# Altium footprint library PcbLib1.PcbLib: 34 footprints (part 3 of 3)
Each footprint in its own frame and in the unit in brackets; x right, y up, seen from the top. Pads: shape width x height; smd on the part's side, far side on the other; paste and mask are expansions set on the pad; w line width, h text height; cw(c..) or ccw(c..) is an arc to the next point about the centre after c.
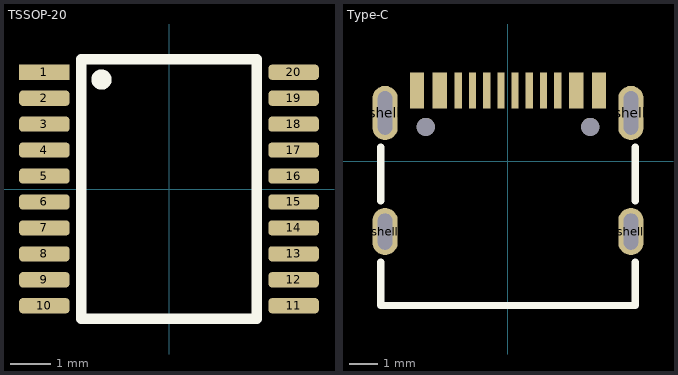
[diagram p2: the footprints below, top view; thin cyan lines are the x and y axes]

## TSSOP-20 [mil]
pads (20):
  rect 50x15 smd: 1(-122.95,115.16)
  rrect50% 50x15 smd: 2(-122.95,89.57) 3(-122.95,63.98) 4(-122.95,38.39) 5(-122.95,12.8) 6(-122.95,-12.8) 7(-122.95,-38.39) 8(-122.95,-63.98) 9(-122.95,-89.57) 10(-122.95,-115.16) 11(122.95,-115.16) 12(122.95,-89.57) 13(122.95,-63.98) 14(122.95,-38.39) 15(122.95,-12.79) 16(122.95,12.8) 17(122.95,38.39) 18(122.95,63.98) 19(122.95,89.57) 20(122.95,115.16)
Top Overlay:
  circle w10: c-66.61,107.95 r5
  lines w10: -86.61,-127.95 86.61,-127.95 86.61,127.95 -86.61,127.95 -86.61,-127.95
3D body "TSSOP-20.step": height 47.24, standoff 0, extent -125.98,-127.95 125.98,127.95

## Type-C [mil]
pads (22):
  rect 10x50 smd: A1(-130.91,97.56) A4(-99.41,97.56) A5(-49.21,97.56) A6(-9.84,97.56) A7(9.84,97.56) A8(49.21,97.56) A9(99.41,97.56) A12(130.91,97.56) B1(121.06,97.56) B4(89.57,97.56) B5(68.9,97.56) B6(29.53,97.56) B7(-29.53,97.56) B8(-68.9,97.56) B9(-89.57,97.56) B12(-121.06,97.56)
  oval 35x65 hole 20 slot 50 at 90 deg: shell(-170.08,-97.56) shell(170.08,-97.56)
  oval 35x75 hole 20 slot 60 at 90 deg: shell(-170.08,66.61) shell(170.08,66.61)
  round 25 hole 25 unplated: ""(-113.78,47.32) ""(113.78,47.32)
Top Overlay:
  lines w10: -175.98,-140.06 -175.98,-199.92 175.98,-199.92 175.98,-140.06 ; -175.98,-55.06 -175.98,19.11 ; 175.98,-55.06 175.98,19.11